# Altium footprint library discret_ic.pcblib: 55 footprints (part 4 of 4)
Each footprint in its own frame and in the unit in brackets; x right, y up, seen from the top. Pads: shape width x height; smd on the part's side, far side on the other; paste and mask are expansions set on the pad; w line width, h text height; cw(c..) or ccw(c..) is an arc to the next point about the centre after c.
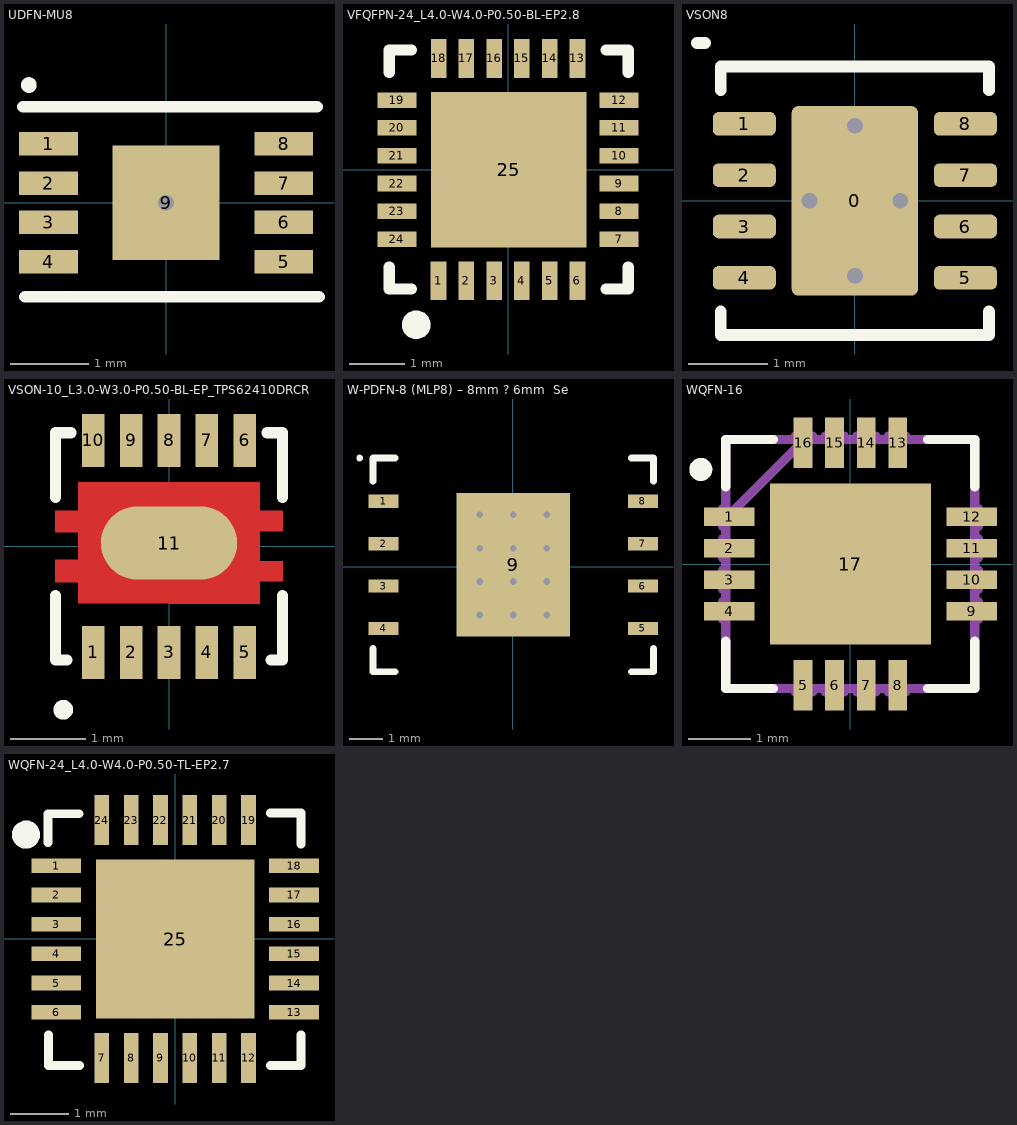
[diagram p3: the footprints below, top view; thin cyan lines are the x and y axes]

## UDFN-MU8 [mm] "SON, 8-Leads, Body 2x3mm, Pitch 0.5mm, Microchip Recommended"
height 0.55
pads (9):
  rect 0.75x0.3 smd: 1(-1.5,0.75) 2(-1.5,0.25) 3(-1.5,-0.25) 4(-1.5,-0.75) 5(1.5,-0.75) 6(1.5,-0.25) 7(1.5,0.25) 8(1.5,0.75)
  rect 1.36x1.46 smd: 9(0,0)
via 0,0 diameter 0.5 hole 0.2
Top Overlay:
  circle w0.1: c-1.75,1.5 r0.05
  lines w0.15: -1.825,1.225 1.925,1.225 ; -1.8,-1.2 1.95,-1.2
3D body: height 0.55, standoff 0, extent -1.524,-1.024 1.524,1.024

## VFQFPN-24_L4.0-W4.0-P0.50-BL-EP2.8 [mm]
pads (25):
  rect 0.28x0.7 smd paste-100 mask+0.051: 1(-1.25,-2) 2(-0.75,-2) 3(-0.25,-2) 4(0.25,-2) 5(0.75,-2) 6(1.25,-2) 13(1.25,2) 14(0.75,2) 15(0.25,2) 16(-0.25,2) 17(-0.75,2) 18(-1.242,2)
  rect 0.7x0.28 smd paste-100 mask+0.051: 7(2,-1.25) 8(2,-0.75) 9(2,-0.25) 10(2,0.25) 11(2,0.75) 12(2,1.25) 19(-2,1.25) 20(-2,0.75) 21(-2,0.25) 22(-2,-0.25) 23(-2,-0.75) 24(-2,-1.25)
  rect 2.8x2.8 smd paste-100 mask+0.051: 25(0.013,0)
Top Overlay:
  region: -1.397,-2.792 -1.398,-2.742 -1.437,-2.649 -1.508,-2.578 -1.602,-2.539 -1.702,-2.54 -1.796,-2.578 -1.867,-2.65 -1.905,-2.743 -1.905,-2.794 -1.905,-2.844 -1.867,-2.937 -1.796,-3.009 -1.702,-3.047 -1.602,-3.048 -1.508,-3.009 -1.437,-2.938 -1.398,-2.845 -1.397,-2.795
  lines w0.2: -2.137,-1.75 -2.137,-2.15 -1.737,-2.15 ; -2.137,1.75 -2.137,2.15 -1.737,2.15 ; 1.763,-2.15 2.163,-2.15 2.163,-1.75 ; 1.763,2.15 2.163,2.15 2.163,1.75
Top Paste:
  region: 1.39,1.65 1.39,2.35 1.11,2.35 1.11,1.65
  region: 0.89,1.65 0.89,2.35 0.61,2.35 0.61,1.65
  region: 0.39,1.65 0.39,2.35 0.11,2.35 0.11,1.65
  region: -0.11,1.65 -0.11,2.35 -0.39,2.35 -0.39,1.65
  region: -0.61,1.65 -0.61,2.35 -0.89,2.35 -0.89,1.65
  region: -1.102,1.65 -1.102,2.35 -1.382,2.35 -1.382,1.65
  region: -1.65,1.11 -1.65,1.39 -2.35,1.39 -2.35,1.11
  region: 1.65,1.39 1.65,1.11 2.35,1.11 2.35,1.39
  region: 1.65,0.89 1.65,0.61 2.35,0.61 2.35,0.89
  region: -1.65,0.61 -1.65,0.89 -2.35,0.89 -2.35,0.61
  region: 1.65,0.39 1.65,0.11 2.35,0.11 2.35,0.39
  region: -2.35,0.39 -2.35,0.11 -1.65,0.11 -1.65,0.39
  region: -1.65,-0.39 -1.65,-0.11 -2.35,-0.11 -2.35,-0.39
  region: 1.65,-0.11 1.65,-0.39 2.35,-0.39 2.35,-0.11
  region: -2.35,-0.61 -2.35,-0.89 -1.65,-0.89 -1.65,-0.61
  region: 1.65,-0.61 1.65,-0.89 2.35,-0.89 2.35,-0.61
  region: -1.65,-1.39 -1.65,-1.11 -2.35,-1.11 -2.35,-1.39
  region: 1.65,-1.11 1.65,-1.39 2.35,-1.39 2.35,-1.11
  region: -1.11,-2.35 -1.11,-1.65 -1.39,-1.65 -1.39,-2.35
  region: 1.11,-1.65 1.11,-2.35 1.39,-2.35 1.39,-1.65
  region: 0.61,-1.65 0.61,-2.35 0.89,-2.35 0.89,-1.65
  region: 0.11,-1.65 0.11,-2.35 0.39,-2.35 0.39,-1.65
  region: -0.61,-2.35 -0.61,-1.65 -0.89,-1.65 -0.89,-2.35
  region: -0.39,-1.65 -0.39,-2.35 -0.11,-2.35 -0.11,-1.65
  region: -1.107,-1.12 -1.107,1.12 1.133,1.12 1.133,-1.12
3D body "User Library-VQFN-24.step": height 1.1, standoff 0.03, extent -2.05,-2.05 2.05,2.05

## VSON8 [mm] "VSON8"
pads (9):
  rrect10% 1.6x2.4 smd mask+0.07: 0(0,0)
  rrect50% 0.8x0.3 smd mask+0.07: 1(-1.4,0.975) 2(-1.4,0.325) 3(-1.4,-0.325) 4(-1.4,-0.975) 5(1.4,-0.975) 6(1.4,-0.325) 7(1.4,0.325) 8(1.4,0.975)
via 0.575,0 diameter 0.4 hole 0.2
via -0.575,0 diameter 0.4 hole 0.2
via 0,0.95 diameter 0.4 hole 0.2
via 0,-0.95 diameter 0.4 hole 0.2
Top Overlay:
  lines w0.15: -2,2 -1.9,2 ; -1.7,-1.4 -1.7,-1.7 1.7,-1.7 1.7,-1.4 ; -1.7,1.4 -1.7,1.7 1.7,1.7 1.7,1.4
3D body "User Library-SON8_3mm.step": height 1, standoff 0, extent -1.575,-1.575 1.575,1.575

## VSON-10_L3.0-W3.0-P0.50-BL-EP_TPS62410DRCR [mm]
pads (11):
  rect 0.3x0.7 smd: 1(-1,-1.4) 2(-0.5,-1.4) 3(0,-1.4) 4(0.5,-1.4) 5(1,-1.4) 6(1,1.4) 7(0.5,1.4) 8(0,1.4) 9(-0.5,1.4) 10(-1,1.4)
  oval 1.8x0.97 smd: 11(0,0.045)
Top Layer:
  region: -1.5,0.472 -1.2,0.472 -1.2,0.85 1.2,0.85 1.2,0.47 1.5,0.47 1.5,0.203 1.2,0.198 1.2,-0.192 1.2,-0.197 1.5,-0.197 1.5,-0.188 1.5,-0.46 1.2,-0.46 1.2,-0.766 -1.2,-0.753 -1.2,-0.472 -1.5,-0.472 -1.5,-0.174 -1.2,-0.174 -1.2,0.185 -1.5,0.188
Top Overlay:
  circle w0.15: c-1.397,-2.159 r0.055
  lines w0.15: -1.5,-0.649 -1.5,-1.5 -1.349,-1.5 ; -1.5,0.651 -1.5,1.5 -1.294,1.5 ; 1.294,1.5 1.5,1.5 1.5,0.649 ; 1.349,-1.5 1.5,-1.5 1.5,-0.649
3D body "User Library-TPS74801.step": height 1, standoff 0, extent -1.5,-1.5 1.5,1.5

## W-PDFN-8 (MLP8) – 8mm ? 6mm  Se [mm]
pads (9):
  rect 0.9x0.4 smd: 1(-3.872,1.955) 2(-3.872,0.685) 3(-3.872,-0.585) 4(-3.872,-1.855) 5(3.898,-1.855) 6(3.898,-0.585) 7(3.898,0.685) 8(3.898,1.955)
  rect 3.4x4.3 smd paste-1.7: 9(0.013,0.05)
via 1.013,-1.45 diameter 0.5 hole 0.2
via 0.013,-1.45 diameter 0.5 hole 0.2
via -0.987,-1.45 diameter 0.5 hole 0.2
via 1.013,-0.45 diameter 0.5 hole 0.2
via 0.013,-0.45 diameter 0.5 hole 0.2
via -0.987,-0.45 diameter 0.5 hole 0.2
via 0.013,1.55 diameter 0.5 hole 0.2
via -0.987,1.55 diameter 0.5 hole 0.2
via 1.013,1.55 diameter 0.5 hole 0.2
via -0.987,0.55 diameter 0.5 hole 0.2
via 0.013,0.55 diameter 0.5 hole 0.2
via 1.013,0.55 diameter 0.5 hole 0.2
Top Overlay:
  circle w0.1: c-4.587,3.25 r0.05
  lines w0.2: -4.187,-2.455 -4.187,-3.15 -3.522,-3.15 ; -4.187,2.555 -4.187,3.25 -3.522,3.25 ; 3.548,-3.15 4.213,-3.15 4.213,-2.455 ; 3.548,3.25 4.213,3.25 4.213,2.555
Top Paste:
  rectangle: 0.678,-1.995 1.608,-0.765
  rectangle: 0.678,-0.565 1.608,0.665
  rectangle: 0.678,0.865 1.608,2.095
  rectangle: -0.452,-1.995 0.478,-0.765
  rectangle: -0.452,-0.565 0.478,0.665
  rectangle: -0.452,0.865 0.478,2.095
  rectangle: -1.581,-1.995 -0.651,-0.765
  rectangle: -1.581,-0.565 -0.651,0.665
  rectangle: -1.581,0.865 -0.651,2.095
3D body "SON127P800X75_HS-9N.step": height 0.75, standoff 0, extent -4.037,-3 4.063,3.1

## WQFN-16 [mil]
pads (17):
  rect 32x12 smd: 1(-77,30) 2(-77,10) 3(-77,-10) 4(-77,-30) 9(77,-30) 10(77,-10) 11(77,10) 12(77,30)
  rect 12x32 smd: 5(-30,-77) 6(-10,-77) 7(10,-77) 8(30,-77) 13(30,77) 14(10,77) 15(-10,77) 16(-30,77)
  rect 102x102 smd: 17(0,0)
Top Overlay:
  circle w9.84: c-95,60 r2.38
  lines w6: -79,-49 -79,-79 -49,-79 ; -79,49 -79,79 -49,79 ; 49,-79 79,-79 79,-49 ; 49,79 79,79 79,49
Plata3D:
  lines w6: -79,29 -29,79 ; -81,-35 -81,-24 -79,-24 -79,-35 -81,-35 ; -81,-16 -81,-4 -79,-4 -79,-16 -81,-16 ; -81,4 -81,16 -79,16 -79,4 -81,4 ; -81,24 -81,35 -79,35 -79,24 -81,24 ; -79,-79 79,-79 79,79 -79,79 -79,-79 ; -35,-81 -35,-79 -24,-79 -24,-81 -35,-81 ; -35,79 -24,79 -24,81 -35,81 -35,79 ; -16,-81 -16,-79 -4,-79 -4,-81 -16,-81 ; -16,79 -4,79 -4,81 -16,81 -16,79 ; 4,-81 4,-79 16,-79 16,-81 4,-81 ; 4,79 16,79 16,81 4,81 4,79 ; 24,-81 24,-79 35,-79 35,-81 24,-81 ; 24,79 35,79 35,81 24,81 24,79 ; 79,-35 79,-24 81,-24 81,-35 79,-35 ; 79,-16 79,-4 81,-4 81,-16 79,-16 ; 79,4 79,16 81,16 81,4 79,4 ; 79,24 79,35 81,35 81,24 79,24
3D body "WQFN-16.STEP": height 32, standoff 0.5, extent -78.74,-78.74 78.74,78.74

## WQFN-24_L4.0-W4.0-P0.50-TL-EP2.7 [mm]
pads (25):
  rect 0.85x0.25 smd paste-100 mask+0.05: 1(-2.025,1.25) 2(-2.025,0.75) 3(-2.025,0.25) 4(-2.025,-0.25) 5(-2.025,-0.75) 6(-2.025,-1.25) 13(2.025,-1.25) 14(2.025,-0.75) 15(2.025,-0.25) 16(2.025,0.25) 17(2.025,0.75) 18(2.025,1.25)
  rect 0.25x0.85 smd paste-100 mask+0.05: 7(-1.25,-2.025) 8(-0.75,-2.025) 9(-0.25,-2.025) 10(0.25,-2.025) 11(0.75,-2.025) 12(1.25,-2.025) 19(1.25,2.025) 20(0.75,2.025) 21(0.25,2.025) 22(-0.25,2.025) 23(-0.75,2.025) 24(-1.25,2.025)
  rect 2.7x2.7 smd paste-100 mask+0.05: 25(0,0)
Top Overlay:
  circle w0.24: c-2.54,1.778 r0.12
  lines w0.15: -2.165,1.646 -2.165,2.134 -1.636,2.134 ; -2.156,-1.631 -2.156,-2.156 -1.63,-2.156 ; 1.621,-2.156 2.144,-2.156 2.144,-1.631 ; 1.621,2.144 2.144,2.144 2.144,1.621
Top Paste:
  region: 0.625,2.45 0.625,1.6 0.875,1.6 0.875,2.45
  region: -1.125,1.6 -1.125,2.45 -1.375,2.45 -1.375,1.6
  region: 1.125,2.45 1.125,1.6 1.375,1.6 1.375,2.45
  region: -0.625,1.6 -0.625,2.45 -0.875,2.45 -0.875,1.6
  region: -0.125,1.6 -0.125,2.45 -0.375,2.45 -0.375,1.6
  region: 0.375,1.6 0.375,2.45 0.125,2.45 0.125,1.6
  region: -1.6,1.125 -1.6,1.375 -2.45,1.375 -2.45,1.125
  region: 2.45,1.125 2.45,1.375 1.6,1.375 1.6,1.125
  region: -1.08,1.08 -1.08,-1.08 1.08,-1.08 1.08,1.08
  region: -1.6,0.625 -1.6,0.875 -2.45,0.875 -2.45,0.625
  region: 2.45,0.625 2.45,0.875 1.6,0.875 1.6,0.625
  region: -1.6,0.125 -1.6,0.375 -2.45,0.375 -2.45,0.125
  region: 2.45,0.125 2.45,0.375 1.6,0.375 1.6,0.125
  region: -1.6,-0.375 -1.6,-0.125 -2.45,-0.125 -2.45,-0.375
  region: 2.45,-0.375 2.45,-0.125 1.6,-0.125 1.6,-0.375
  region: -1.6,-0.875 -1.6,-0.625 -2.45,-0.625 -2.45,-0.875
  region: 2.45,-0.875 2.45,-0.625 1.6,-0.625 1.6,-0.875
  region: -1.6,-1.375 -1.6,-1.125 -2.45,-1.125 -2.45,-1.375
  region: 2.45,-1.375 2.45,-1.125 1.6,-1.125 1.6,-1.375
  region: -1.125,-2.45 -1.125,-1.6 -1.375,-1.6 -1.375,-2.45
  region: -0.875,-1.6 -0.875,-2.45 -0.625,-2.45 -0.625,-1.6
  region: -0.375,-1.6 -0.375,-2.45 -0.125,-2.45 -0.125,-1.6
  region: 1.375,-2.45 1.375,-1.6 1.125,-1.6 1.125,-2.45
  region: 0.125,-1.6 0.125,-2.45 0.375,-2.45 0.375,-1.6
  region: 0.625,-1.6 0.625,-2.45 0.875,-2.45 0.875,-1.6
3D body "User Library-QFN-24 - EQ.step": height 1, standoff 0, extent -2,-2 2,2